# Altium footprint library master.PcbLib: 98 footprints (part 5 of 7)
Each footprint in its own frame and in the unit in brackets; x right, y up, seen from the top. Pads: shape width x height; smd on the part's side, far side on the other; paste and mask are expansions set on the pad; w line width, h text height; cw(c..) or ccw(c..) is an arc to the next point about the centre after c.
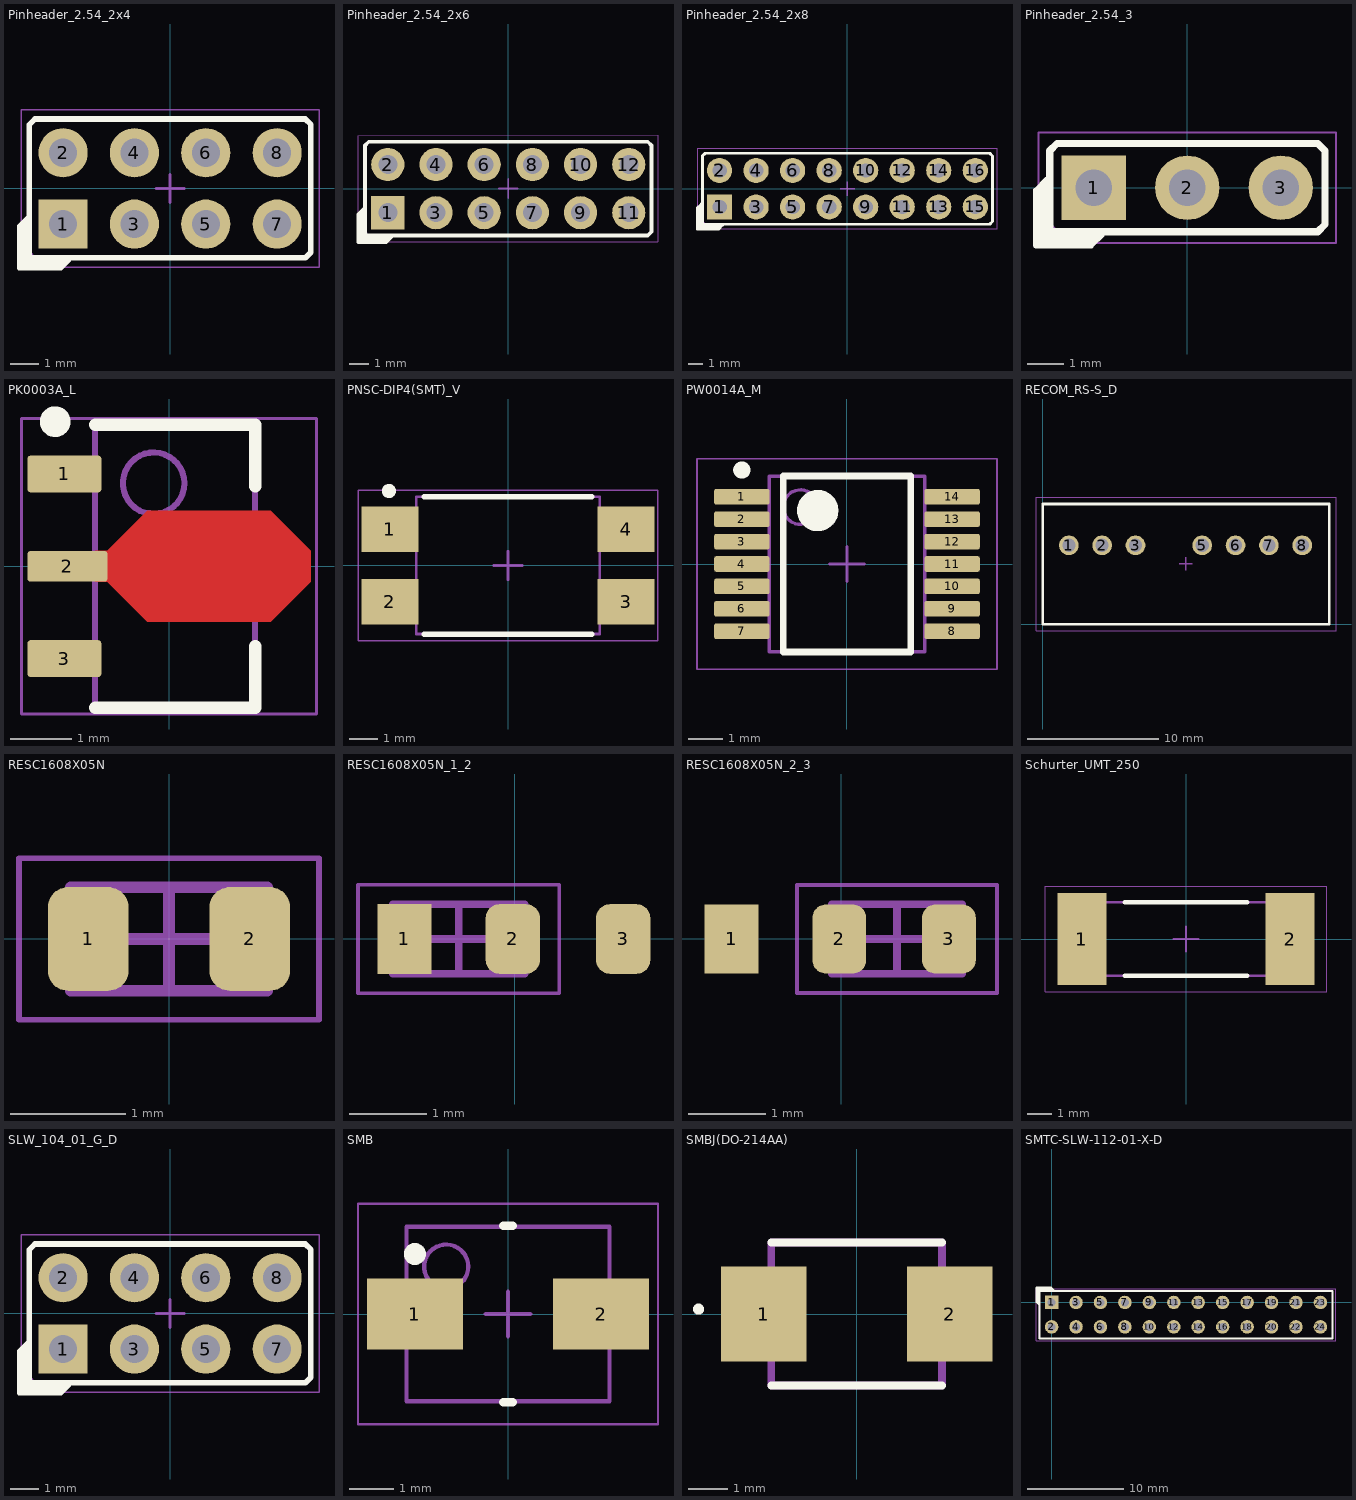
[diagram p4: the footprints below, top view; thin cyan lines are the x and y axes]

## Pinheader_2.54_2x4 [mm] "Pinheader, 2.54mm, gerade, 2-reihig"
height 8.7
pads (8):
  rect 1.75x1.75 hole 1: 1(-3.81,-1.27)
  round 1.75 hole 1: 2(-3.81,1.27) 3(-1.27,-1.27) 4(-1.27,1.27) 5(1.27,-1.27) 6(1.27,1.27) 7(3.81,-1.27) 8(3.81,1.27)
Top Overlay:
  region: -5.08,-1.04 -5.08,-2.54 -3.58,-2.54 -3.88,-2.84 -5.38,-2.84 -5.38,-1.34
  lines w0.15: -5.08,-1.04 -5.38,-1.34 -5.38,-2.84 -3.88,-2.84 -3.58,-2.54
  lines w0.2: -5.01,-2.47 4.81,-2.47 5.01,-2.27 5.01,2.27 4.81,2.47 -4.81,2.47 -5.01,2.27 -5.01,-2.47
Mechanical 13:
  lines w0.1: -5.01,-2.27 -4.81,-2.47 4.81,-2.47 5.01,-2.27 5.01,2.27 4.81,2.47 -4.81,2.47 -5.01,2.27 -5.01,-2.27
Mechanical 15:
  lines w0.05: -5.3,-2.8 -5.3,2.8 5.3,2.8 5.3,-2.8 -5.3,-2.8
  lines w0.1: -0.5,0 0.5,0 ; 0,-0.5 0,0.5
3D body "stiftleiste_254_gerade_2x4.stp": height 8.74, standoff -2.86, extent -5.08,-2.54 5.08,2.54

## Pinheader_2.54_2x6 [mm] "Pinheader, 2.54mm, gerade, 2-reihig"
height 8.7
pads (12):
  rect 1.75x1.75 hole 1: 1(-6.35,-1.27)
  round 1.75 hole 1: 2(-6.35,1.27) 3(-3.81,-1.27) 4(-3.81,1.27) 5(-1.27,-1.27) 6(-1.27,1.27) 7(1.27,-1.27) 8(1.27,1.27) 9(3.81,-1.27) 10(3.81,1.27) 11(6.35,-1.27) 12(6.35,1.27)
Top Overlay:
  region: -7.62,-1.04 -7.62,-2.54 -6.12,-2.54 -6.42,-2.84 -7.92,-2.84 -7.92,-1.34
  lines w0.15: -7.62,-1.04 -7.92,-1.34 -7.92,-2.84 -6.42,-2.84 -6.12,-2.54
  lines w0.2: -7.55,-2.47 7.35,-2.47 7.55,-2.27 7.55,2.27 7.35,2.47 -7.35,2.47 -7.55,2.27 -7.55,-2.47
Mechanical 13:
  lines w0.1: -7.55,-2.27 -7.35,-2.47 7.35,-2.47 7.55,-2.27 7.55,2.27 7.35,2.47 -7.35,2.47 -7.55,2.27 -7.55,-2.27
Mechanical 15:
  lines w0.05: 7.874,-2.801 -7.9,-2.794 -7.9,2.794 7.89,2.801 7.89,-2.8
  lines w0.1: -0.5,0 0.5,0 ; 0,-0.5 0,0.5
3D body "stiftleiste_254_gerade_2x6.stp": height 8.74, standoff -2.86, extent -7.62,-2.54 7.62,2.54

## Pinheader_2.54_2x8 [mm] "Pinheader, 2.54mm, gerade, 2-reihig"
height 8.7
pads (16):
  rect 1.75x1.75 hole 1: 1(-8.89,-1.27)
  round 1.75 hole 1: 2(-8.89,1.27) 3(-6.35,-1.27) 4(-6.35,1.27) 5(-3.81,-1.27) 6(-3.81,1.27) 7(-1.27,-1.27) 8(-1.27,1.27) 9(1.27,-1.27) 10(1.27,1.27) 11(3.81,-1.27) 12(3.81,1.27) 13(6.35,-1.27) 14(6.35,1.27) 15(8.89,-1.27) 16(8.89,1.27)
Top Overlay:
  region: -10.16,-1.04 -10.16,-2.54 -8.66,-2.54 -8.96,-2.84 -10.46,-2.84 -10.46,-1.34
  lines w0.15: -10.16,-1.04 -10.46,-1.34 -10.46,-2.84 -8.96,-2.84 -8.66,-2.54
  lines w0.2: -10.09,-2.47 9.89,-2.47 10.09,-2.27 10.09,2.27 9.89,2.47 -9.89,2.47 -10.09,2.27 -10.09,-2.47
Mechanical 13:
  lines w0.1: -10.09,-2.27 -10.09,2.27 -9.89,2.47 9.89,2.47 10.09,2.27 10.09,-2.27 9.89,-2.47 -9.89,-2.47 -10.09,-2.27
Mechanical 15:
  lines w0.05: -10.4,-2.8 -10.4,2.8 10.4,2.8 10.4,-2.8 -10.4,-2.8
  lines w0.1: -0.5,0 0.5,0 ; 0,-0.5 0,0.5
3D body "stiftleiste_254_gerade_2x8.stp": height 8.74, standoff -2.86, extent -10.16,-2.54 10.16,2.54

## Pinheader_2.54_3 [mm] "Pinheader, 2.54mm, gerade"
height 8.7
pads (3):
  rect 1.75x1.75 hole 1: 1(-2.54,0)
  round 1.75 hole 1: 2(0,0) 3(2.54,0)
Top Overlay:
  region: -3.81,0.23 -3.81,-1.27 -2.31,-1.27 -2.61,-1.57 -4.11,-1.57 -4.11,-0.07
  lines w0.15: -3.81,0.23 -4.11,-0.07 -4.11,-1.57 -2.61,-1.57 -2.31,-1.27
  lines w0.2: -3.74,-1.2 -3.74,1 -3.54,1.2 3.54,1.2 3.74,1 3.74,-1 3.54,-1.2 -3.74,-1.2
Mechanical 13:
  lines w0.1: -3.74,-1 -3.54,-1.2 3.54,-1.2 3.74,-1 3.74,1 3.54,1.2 -3.54,1.2 -3.74,1 -3.74,-1
Mechanical 15:
  lines w0.05: -4.04,-1.5 -4.04,1.5 4.04,1.5 4.04,-1.5 -4.04,-1.5
  lines w0.1: -0.5,0 0.5,0 ; 0,-0.5 0,0.5
3D body "stiftleiste_254_gerade_3.stp": height 8.74, standoff -2.86, extent -3.81,-1.27 3.81,1.27

## PK0003A_L [mm] "SOT89, 3-Leads, Body 4.6x2.6mm, Pitch 1.5mm, IPC High Density"
height 1.6
pads (3):
  rrect17% 1.2x0.6 smd: 1(-1.7,1.5) 3(-1.7,-1.5)
  rrect20% 1.3x0.5 smd: 2(-1.65,0)
Top Layer:
  region: -1,0.25 -0.35,0.9 1.65,0.9 2.3,0.25 2.3,-0.25 1.65,-0.9 -0.35,-0.9 -1,-0.25 -1.2,-0.25 -1.2,0.25
Top Overlay:
  circle w0.25: c-1.85,2.35 r0.125
  lines w0.2: -1.2,-2.3 1.4,-2.3 1.4,-1.3 ; -1.2,2.3 1.4,2.3 1.4,1.3
Mechanical 1:
  text ".Designator" at -0.254,0.381 h0.8
Mechanical 13:
  circle w0.1: c-0.25,1.35 r0.5
  lines w0.1: -1.2,-2.3 1.4,-2.3 1.4,2.3 -1.2,2.3 -1.2,-2.3
Mechanical 15:
  lines w0.05: -2.4,-2.4 2.4,-2.4 2.4,2.4 -2.4,2.4 -2.4,-2.4
  lines w0.1: -0.4,0 0.6,0 ; 0.1,-0.5 0.1,0.5
3D body "PK0003A.stp": height 1.6, standoff 0, extent -2.186,-2.3 2.186,2.3

## PNSC-DIP4(SMT)_V [mm] "DIP(SMT), 4-Leads, Body 6.4x4.78mm, Pitch 2.54mm"
height 3
pads (4):
  rect 2x1.6 smd: 1(-4.15,1.27) 2(-4.15,-1.27) 3(4.15,-1.27) 4(4.15,1.27)
Top Overlay:
  circle w0.25: c-4.189,2.62 r0.125
  lines w0.2: -2.948,-2.415 2.948,-2.415 ; -2.948,2.415 2.948,2.415
Mechanical 13:
  lines w0.1: -3.225,-2.415 3.225,-2.415 3.225,2.415 -3.225,2.415 -3.225,-2.415
Mechanical 15:
  lines w0.05: -5.275,-2.64 5.275,-2.64 5.275,2.64 -5.275,2.64 -5.275,-2.64
  lines w0.1: -0.5,0 0.5,0 ; 0,-0.5 0,0.5
3D body: height 3, standoff 0.2, extent -3.225,-2.415 3.225,2.415

## PW0014A_M [mm] "SOP, 14-Leads, Body 5.1x4.5mm, Pitch 0.65mm, IPC Low Density"
height 1.2
pads (14):
  rrect22% 1.6x0.45 smd: 1(-3.05,1.95) 2(-3.05,1.3) 3(-3.05,0.65) 4(-3.05,0) 5(-3.05,-0.65) 6(-3.05,-1.3) 7(-3.05,-1.95) 8(3.05,-1.95) 9(3.05,-1.3) 10(3.05,-0.65) 11(3.05,0) 12(3.05,0.65) 13(3.05,1.3) 14(3.05,1.95)
Top Overlay:
  circle w0.6: c-0.85,1.55 r0.3
  circle w0.25: c-3.05,2.725 r0.125
  lines w0.2: -1.85,-2.55 1.85,-2.55 1.85,2.55 -1.85,2.55 -1.85,-2.55
Mechanical 13:
  circle w0.1: c-1.35,1.65 r0.5
  lines w0.1: -2.25,-2.55 2.25,-2.55 2.25,2.55 -2.25,2.55 -2.25,-2.55
Mechanical 15:
  lines w0.05: -4.35,-3.05 4.35,-3.05 4.35,3.05 -4.35,3.05 -4.35,-3.05
  lines w0.1: -0.5,0 0.5,0 ; 0,-0.5 0,0.5
3D body "PW0014AakaMTC14.stp": height 1, standoff 0, extent -3.21,-2.5 3.21,2.5

## RECOM_RS-S_D [mm] "Recom DC/DC Converter"
height 11.1
pads (7):
  round 1.5 hole 1: 1(2,6) 2(4.54,6) 3(7.08,6) 5(12.16,6) 6(14.7,6) 7(17.24,6) 8(19.78,6)
Top Overlay:
  lines w0.2: 0,0 0,9.144 21.844,9.144 21.844,0 0,0
Mechanical 13:
  lines w0.1: 0,0 21.844,0 21.844,9.144 0,9.144 0,0
Mechanical 15:
  lines w0.05: -0.5,-0.5 -0.5,9.652 22.352,9.652 22.352,-0.5 -0.5,-0.5
  lines w0.1: 10.4,4.6 11.4,4.6 ; 10.9,4.1 10.9,5.1
3D body: height 11.1, standoff 0, extent 0,0 21.8,9.2

## RESC1608X05N [mm] "Chip Resistor, 2-Leads, Body 1,60x0,80mm, IPC Medium Density"
height 0.45
pads (2):
  rrect50% 0.7x0.9 smd: 1(-0.7,0) 2(0.7,0)
Mechanical 13:
  lines w0.1: -0.85,-0.45 -0.85,0.45 0.85,0.45 0.85,-0.45 -0.85,-0.45
Mechanical 15:
  lines w0.05: -1.3,-0.7 -1.3,0.7 1.3,0.7 1.3,-0.7 -1.3,-0.7
  lines w0.1: -0.45,0 0.45,0 ; 0,-0.45 0,0.45
3D body "RESC1608X05N.step": height 0.45, standoff 0, extent -0.85,-0.45 0.85,0.45

## RESC1608X05N_1_2 [mm] "Chip Resistor, 2-Leads, Body 1,60x0,80mm, IPC Medium Density"
height 0.45
pads (3):
  rect 0.7x0.9 smd: 1(-1.425,0)
  rrect50% 0.7x0.9 smd: 2(-0.025,0)
  rrect50% 0.7x0.9 smd paste-2: 3(1.4,0)
Mechanical 13:
  lines w0.1: -1.575,-0.45 0.125,-0.45 0.125,0.45 -1.575,0.45 -1.575,-0.45
Mechanical 15:
  lines w0.05: -2.025,-0.7 0.575,-0.7 0.575,0.7 -2.025,0.7 -2.025,-0.7
  lines w0.1: -1.175,0 -0.275,0 ; -0.725,-0.45 -0.725,0.45
3D body "RESC1608X05N.step": height 0.45, standoff 0, extent -1.575,-0.45 0.125,0.45

## RESC1608X05N_2_3 [mm] "Chip Resistor, 2-Leads, Body 1,60x0,80mm, IPC Medium Density"
height 0.45
pads (3):
  rect 0.7x0.9 smd paste-2: 1(-1.425,0)
  rrect50% 0.7x0.9 smd: 2(-0.025,0) 3(1.4,0)
Mechanical 13:
  lines w0.1: -0.125,-0.45 -0.125,0.45 1.575,0.45 1.575,-0.45 -0.125,-0.45
Mechanical 15:
  lines w0.05: -0.575,-0.7 -0.575,0.7 2.025,0.7 2.025,-0.7 -0.575,-0.7
  lines w0.1: 0.275,0 1.175,0 ; 0.725,-0.45 0.725,0.45
3D body "RESC1608X05N.step": height 0.45, standoff 0, extent -0.125,-0.45 1.575,0.45

## Schurter_UMT_250 [mm] "Schurter UMT 250 Series Fuse"
height 3
pads (2):
  rect 2x3.75 smd: 1(-4.25,0) 2(4.25,0)
Top Overlay:
  lines w0.2: -2.5,-1.5 2.5,-1.5 ; -2.5,1.5 2.5,1.5
Mechanical 13:
  lines w0.1: -5.05,-1.5 5.05,-1.5 5.05,1.5 -5.05,1.5 -5.05,-1.5
Mechanical 15:
  lines w0.05: -5.75,-2.15 5.75,-2.15 5.75,2.15 -5.75,2.15 -5.75,-2.15
  lines w0.1: -0.5,0 0.5,0 ; 0,-0.5 0,0.5
3D body "INDC10130X30N.step": height 3, standoff 0, extent -5.05,-1.5 5.05,1.5

## SLW_104_01_G_D [mm] "Board-To-Board Connector, Dual, 2.54 mm, 8 Contacts, Receptacle, SLW Series, Through Hole, 2 Rows"
height 4.57
pads (8):
  rect 1.75x1.75 hole 1: 1(-3.81,-1.27)
  round 1.75 hole 1: 2(-3.81,1.27) 3(-1.27,-1.27) 4(-1.27,1.27) 5(1.27,-1.27) 6(1.27,1.27) 7(3.81,-1.27) 8(3.81,1.27)
Top Overlay:
  region: -5.08,-1.04 -5.08,-2.54 -3.58,-2.54 -3.88,-2.84 -5.38,-2.84 -5.38,-1.34
  lines w0.15: -5.08,-1.04 -5.38,-1.34 -5.38,-2.84 -3.88,-2.84 -3.58,-2.54
  lines w0.2: -5.01,-2.47 -5.01,2.27 -4.81,2.47 4.81,2.47 5.01,2.27 5.01,-2.27 4.81,-2.47 -5.01,-2.47
Mechanical 13:
  lines w0.1: -5.01,-2.27 -5.01,2.27 -4.81,2.47 4.81,2.47 5.01,2.27 5.01,-2.27 4.81,-2.47 -4.81,-2.47 -5.01,-2.27
Mechanical 15:
  lines w0.05: -5.3,-2.8 -5.3,2.8 5.3,2.8 5.3,-2.8 -5.3,-2.8
  lines w0.1: -0.5,0 0.5,0 ; 0,-0.5 0,0.5
3D body "SLW-104-01-G-D.stp": height 4.57, standoff -2.92, extent -5.08,-2.477 5.08,2.476

## SMB [mm] "SMB Diode footprint"
height 2.45
pads (2):
  rect 2.18x1.62 smd: 1(-2.11,0) 2(2.11,0)
Top Overlay:
  circle w0.25: c-2.11,1.36 r0.125
  lines w0.2: -0.1,-2 0.1,-2 ; -0.1,2 0.1,2
Mechanical 13:
  circle w0.1: c-1.4,1.075 r0.5
  lines w0.1: -2.3,-1.975 2.3,-1.975 2.3,1.975 -2.3,1.975 -2.3,-1.975
Mechanical 15:
  lines w0.05: -3.4,-2.5 3.4,-2.5 3.4,2.5 -3.4,2.5 -3.4,-2.5
  lines w0.1: -0.5,0 0.5,0 ; 0,-0.5 0,0.5
3D body "SMB.step": height 2.45, standoff 0, extent -2.875,-1.975 2.875,1.975

## SMBJ(DO-214AA) [mm]
pads (2):
  rect 2.16x2.4 smd: 1(-2.35,0) 2(2.35,0)
Top Overlay:
  circle w0.2: c-3.992,0.123 r0.039
  lines w0.2: -2.155,-1.81 2.155,-1.81 ; -2.155,1.81 2.155,1.81
Mechanical 13:
  lines w0.2: -2.155,-1.81 2.155,-1.81 2.155,1.81 -2.155,1.81 -2.155,-1.81

## SMTC-SLW-112-01-X-D [mm] "Low Profile Socket Strip, 2x12 Pins, Vertical, 2.54mm Pitch, Female"
height 4.57
pads (24):
  rect 1.4x1.4 hole 0.86: 1(0,0)
  round 1.4 hole 0.86: 2(0,-2.54) 3(2.54,0) 4(2.54,-2.54) 5(5.08,0) 6(5.08,-2.54) 7(7.62,0) 8(7.62,-2.54) 9(10.16,0) 10(10.16,-2.54) 11(12.7,0) 12(12.7,-2.54) 13(15.24,0) 14(15.24,-2.54) 15(17.78,0) 16(17.78,-2.54) 17(20.32,0) 18(20.32,-2.54) 19(22.86,0) 20(22.86,-2.54) 21(25.4,0) 22(25.4,-2.54) 23(27.94,0) 24(27.94,-2.54)
Top Overlay:
  region: 0.23,1.27 -1.27,1.27 -1.27,-0.23 -1.57,0.07 -1.57,1.57 -0.07,1.57
  lines w0.15: -1.27,-0.23 -1.57,0.07 -1.57,1.57 -0.07,1.57 0.23,1.27
  lines w0.2: -1.27,-3.745 29.2,-3.745 29.2,1.205 -1.27,1.205 -1.27,-3.745
Mechanical 13:
  lines w0.1: -1.27,-3.745 29.2,-3.745 29.2,1.205 -1.27,1.205 -1.27,-3.745
Mechanical 15:
  lines w0.05: -1.62,-3.97 29.56,-3.97 29.56,1.43 -1.62,1.43 -1.62,-3.97
3D body "SLW-112-01-X-D.step": height 4.57, standoff -2.92, extent -1.27,-3.746 29.21,1.207